# Altium footprint library PBL - THD Packages.PcbLib: 256 footprints (part 10 of 16)
Each footprint in its own frame and in the unit in brackets; x right, y up, seen from the top. Pads: shape width x height; smd on the part's side, far side on the other; paste and mask are expansions set on the pad; w line width, h text height; cw(c..) or ccw(c..) is an arc to the next point about the centre after c.
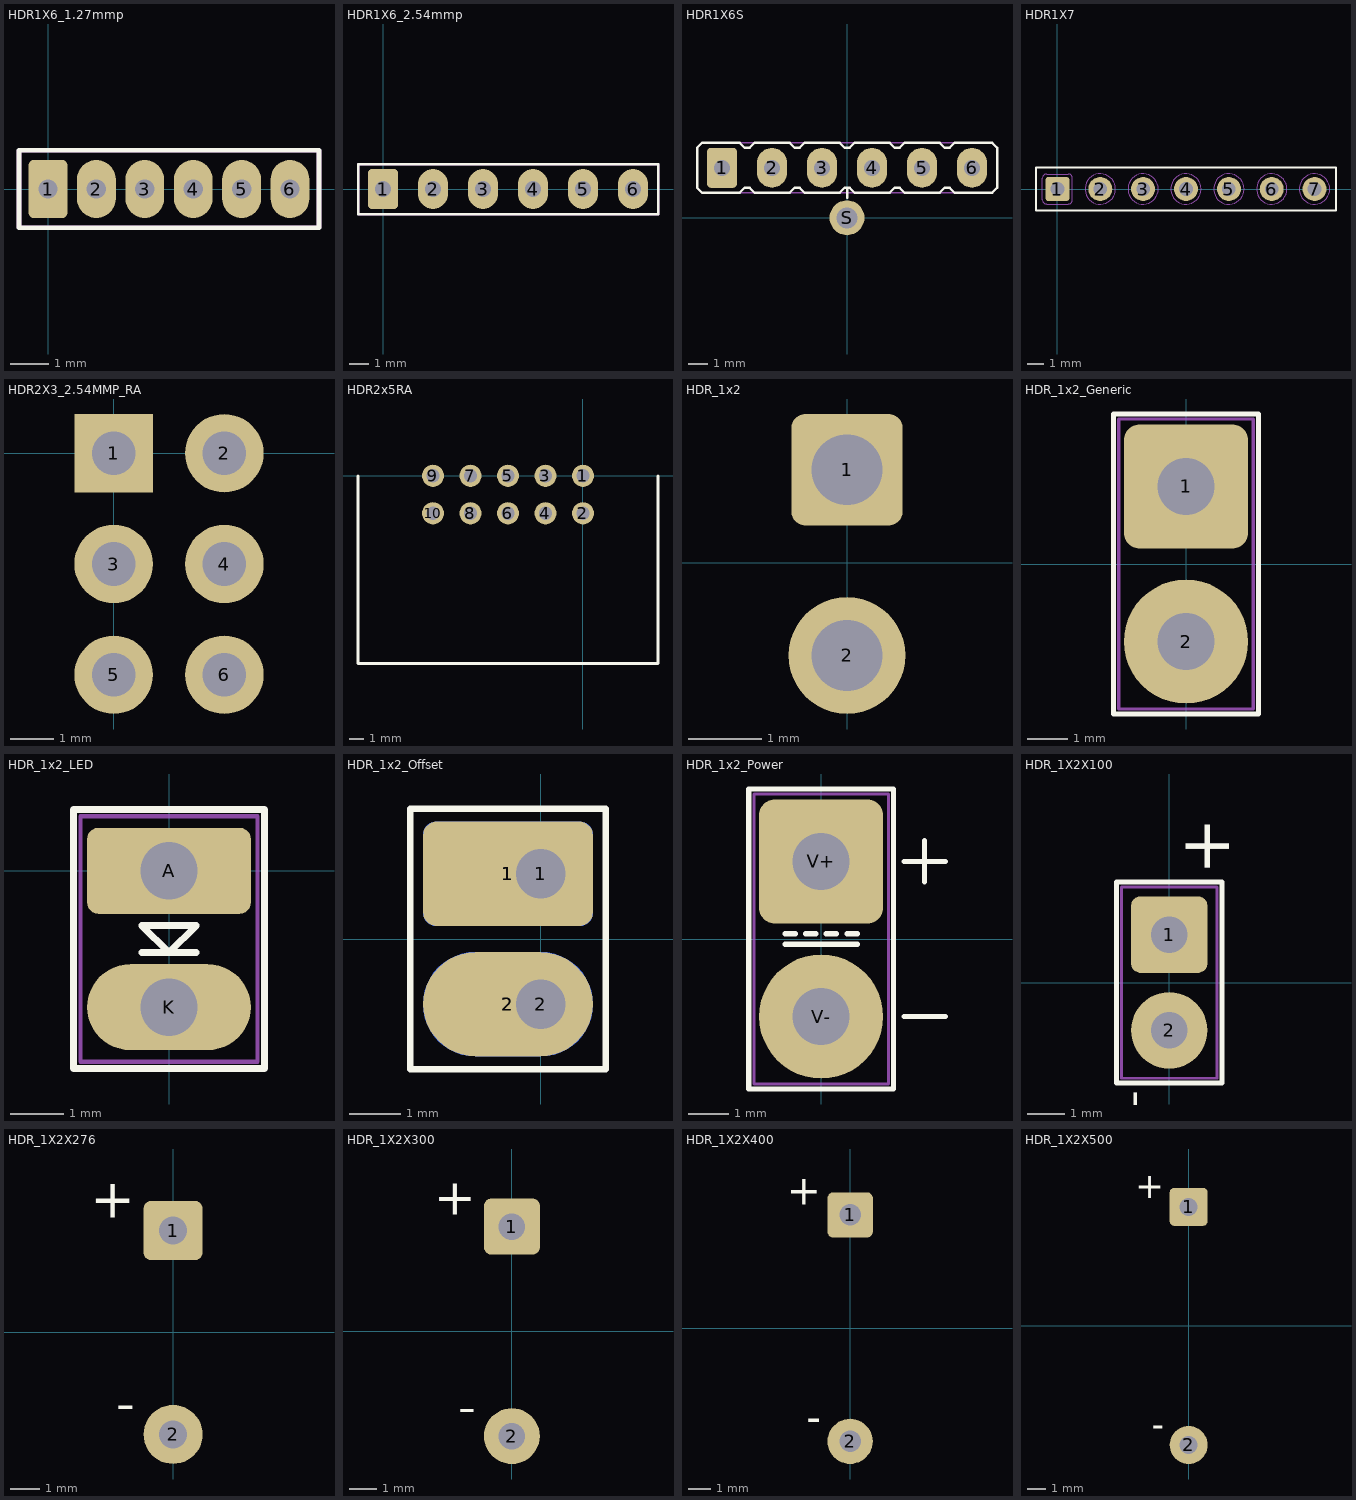
[diagram p9: the footprints below, top view; thin cyan lines are the x and y axes]

## HDR1X6_1.27mmp [mil] "Connector; Header; 6 Position, 0.050\" pitch"
pads (6):
  rrect25% 40x60 hole 20: 1(0,0)
  oval 40x60 hole 20: 2(50,0) 3(100,0) 4(150,0) 5(200,0) 6(250,0)
Top Overlay:
  lines w5: -30,-40 -30,40 280,40 280,-40 -30,-40
Bottom Solder:
  rectangle: 0,-30 250,30
13 - 3D Top Side:
  lines w5: -30,-40 -30,40 280,40 280,-40 -30,-40

## HDR1X6_2.54mmp [mil] "Connector; Header; 6 Position 0.100\" pitch"
pads (6):
  rrect25% 60x80 hole 32: 1(0,0)
  oval 60x80 hole 32: 2(100,0) 3(200,0) 4(300,0) 5(400,0) 6(500,0)
Top Overlay:
  lines w5: -50,-50 -50,50 550,50 550,-50 -50,-50
13 - 3D Top Side:
  lines w5: -50,-50 550,-50 550,50 -50,50 -50,-50

## HDR1X6S [mil] "Connector; Special 6-position header with shield term"
pads (7):
  rrect25% 60x80 hole 32: 1(-250,100)
  oval 60x80 hole 32: 2(-150,100) 3(-50,100) 4(50,100) 5(150,100) 6(250,100)
  round 70 hole 42: S(0,0)
Top Overlay:
  lines w5: 0,40 0,60 ; -300,60 -290,50 -215,50 -205,60 -195,60 -185,50 -115,50 -105,60 -95,60 -85,50 -15,50 -5,60 5,60 15,50 85,50 95,60 105,60 115,50 185,50 195,60 205,60 215,50 290,50 300,60 300,140 290,150 215,150 205,140 195,140 185,150 115,150 105,140 95,140 85,150 15,150 5,140 -5,140 -15,150 -85,150 -95,140 -105,140 -115,150 -185,150 -195,140 -205,140 -215,150 -290,150 -300,140 -300,60
13 - 3D Top Side:
  lines w3: -300,60 -300,140 -290,150 290,150 300,140 300,60 290,50 -290,50 -300,60

## HDR1X7 [mil] "Connector; Header; 7 Position"
pads (7):
  rrect25% 56x56 / inner rrect25% 56x56 / far side rrect25% 72x72 hole 32: 1(0,0)
  round 56 / inner round 56 / far side round 72 hole 32: 2(100,0) 3(200,0) 4(300,0) 5(400,0) 6(500,0) 7(600,0)
Top Overlay:
  lines w5: -50,-50 650,-50 650,50 -50,50 -50,-50
13 - 3D Top Side:
  circle w1.97: c0,0 r16
  circle w1.97: c100,0 r35.43
  circle w1.97: c100,0 r16
  circle w1.97: c200,0 r16
  circle w1.97: c200,0 r35.43
  circle w1.97: c300,0 r16
  circle w1.97: c300,0 r35.43
  circle w1.97: c400,0 r16
  circle w1.97: c400,0 r35.43
  circle w1.97: c500,0 r16
  circle w1.97: c500,0 r35.43
  circle w1.97: c600,0 r16
  circle w1.97: c600,0 r35.43
  lines w1.97: -35,-25 ccw(c-25,-25) -25,-35 25,-35 ccw(c25,-25) 35,-25 35,25 ccw(c25,25) 25,35 -25,35 ccw(c-25,25) -35,25 -35,-25

## HDR2X3_2.54MMP_RA [mm] "2 x 3 pin header right angle"
pads (6):
  rect 1.8x1.8 hole 1 mask+0.102: 1(0,0)
  round 1.8 hole 1 mask+0.102: 2(2.54,0) 3(0,-2.54) 4(2.54,-2.54) 5(0,-5.08) 6(2.54,-5.08)
3D body "Pin Header 2x3 TH Angle Pitch 2.54mm.stp": height 5.63, standoff -3.2, extent -0.276,-6.35 13.462,1.27

## HDR2x5RA [mm]
pads (10):
  round 1.5 hole 0.9: 1(0,0) 2(0,-2.54) 3(-2.54,0) 4(-2.54,-2.54) 5(-5.08,0) 6(-5.08,-2.54) 7(-7.62,0) 8(-7.62,-2.54) 9(-10.16,0) 10(-10.16,-2.54)
Top Overlay:
  lines w0.2: -15.24,0 -15.24,-12.7 5.08,-12.7 5.08,0

## HDR_1x2 [mil]
pads (2):
  rrect25% 60x60 hole 38: 1(0,50)
  round 62.99 hole 38: 2(0,-50)
3D body: height -3, standoff -5, extent -19.84,-19.96 20,19.96

## HDR_1x2_Generic [mil] "Connector Header, Single-row 2-position, 0.200\" pitch"
height 235
pads (2):
  rrect25% 120x120 hole 55: 1(0,75)
  round 120 hole 55: 2(0,-75)
Top Overlay:
  lines w5: -70,-145 -70,145 70,145 70,-145 -70,-145
13 - 3D Top Side:
  lines w3: -65,-140 -65,140 65,140 65,-140 -65,-140

## HDR_1x2_LED [mil] "Connector Header, Single-row 2-position, 0.100\" pitch"
height 235
pads (2):
  rrect25% 120x63 hole 42: A(0,0)
  oval 120x63 hole 42: K(0,-100)
Top Overlay:
  lines w5: -20,-60 20,-60 ; -70,-145 70,-145 70,45 -70,45 -70,-145 ; -20,-40 0,-60 20,-40 -20,-40
13 - 3D Top Side:
  lines w3: -65,-140 65,-140 65,40 -65,40 -65,-140

## HDR_1x2_Offset [mil]
pads (6):
  rrect25% 130x80 smd far side: 1(-25,50)
  rrect25% 130x80 smd: 1(-25,50)
  rrect25% 60x60 hole 38: 1(0,50)
  oval 130x80 smd far side: 2(-25,-50)
  oval 130x80 smd: 2(-25,-50)
  round 60 hole 38: 2(0,-50)
Top Overlay:
  lines w5: -100,-100 50,-100 50,100 -100,100 -100,-100

## HDR_1x2_Power [mil] "Connector Header, Single-row 2-position, 0.200\" pitch"
height 235
pads (2):
  rrect25% 120x120 hole 55: V+(0,75)
  round 120 hole 55: V-(0,-75)
Top Overlay:
  lines w5: -35,-5 35,-5 ; -35,5 -25,5 ; -15,5 -5,5 ; 5,5 15,5 ; 25,5 35,5 ; 80,-75 120,-75 ; 80,75 120,75 ; 100,55 100,95 ; -70,-145 70,-145 70,145 -70,145 -70,-145
13 - 3D Top Side:
  lines w3: -65,-140 65,-140 65,140 -65,140 -65,-140

## HDR_1X2X100 [mil]
pads (2):
  rrect25% 80x80 hole 38: 1(0,50)
  round 80 hole 38: 2(0,-50)
Top Overlay:
  lines w5: -55,-105 -55,105 55,105 55,-105 -55,-105
  text "+" at 0,112.2 h90
  text "-" at 0,-111.22 h90
13 - 3D Top Side:
  lines w3: -50,-100 -50,100 50,100 50,-100 -50,-100
3D body: height -3, standoff -5, extent -19.84,-19.96 20,19.96

## HDR_1X2X276 [mil]
pads (2):
  rrect25% 80x80 hole 38: 1(0,137.8)
  round 80 hole 38: 2(0,-137.8)
Top Overlay:
  text "+" at -51.18,137.8 h90
  text "-" at -51.18,-137.8 h90
Bottom Overlay:
  text "-" at -51.18,-137.8 h90
  text "+" at -51.18,137.8 h90
3D body: height -3, standoff -5, extent -19.84,117.84 20,157.76
3D body: height -3, standoff -5, extent -19.84,-157.75 20,-117.83

## HDR_1X2X300 [mil]
pads (2):
  rrect25% 80x80 hole 38: 1(0,150)
  round 80 hole 38: 2(0,-150)
Top Overlay:
  text "-" at -51.18,-149.61 h90
  text "+" at -51.18,149.61 h90
3D body: height -3, standoff -5, extent -19.84,130.04 20,169.96
3D body: height -3, standoff -5, extent -19.84,-169.96 20,-130.04

## HDR_1X2X400 [mil]
pads (2):
  rrect25% 80x80 hole 38: 1(0,200)
  round 80 hole 38: 2(0,-200)
Top Overlay:
  text "-" at -51.18,-200 h90
  text "+" at -51.18,200 h90
3D body: height -3, standoff -5, extent -19.84,180.04 20,219.96
3D body: height -3, standoff -5, extent -19.84,-219.96 20,-180.04

## HDR_1X2X500 [mil]
pads (2):
  rrect25% 80x80 hole 38: 1(0,250)
  round 80 hole 38: 2(0,-250)
Top Overlay:
  text "-" at -51.18,-250 h90
  text "+" at -51.18,250 h90
3D body: height 1.97, standoff 0, extent -39.68,-289.91 40.01,-210.07
3D body: height 1.97, standoff 0, extent -40,210 40,290